# Altium footprint library IDETEC.PcbLib: 275 footprints (part 11 of 18)
Each footprint in its own frame and in the unit in brackets; x right, y up, seen from the top. Pads: shape width x height; smd on the part's side, far side on the other; paste and mask are expansions set on the pad; w line width, h text height; cw(c..) or ccw(c..) is an arc to the next point about the centre after c.
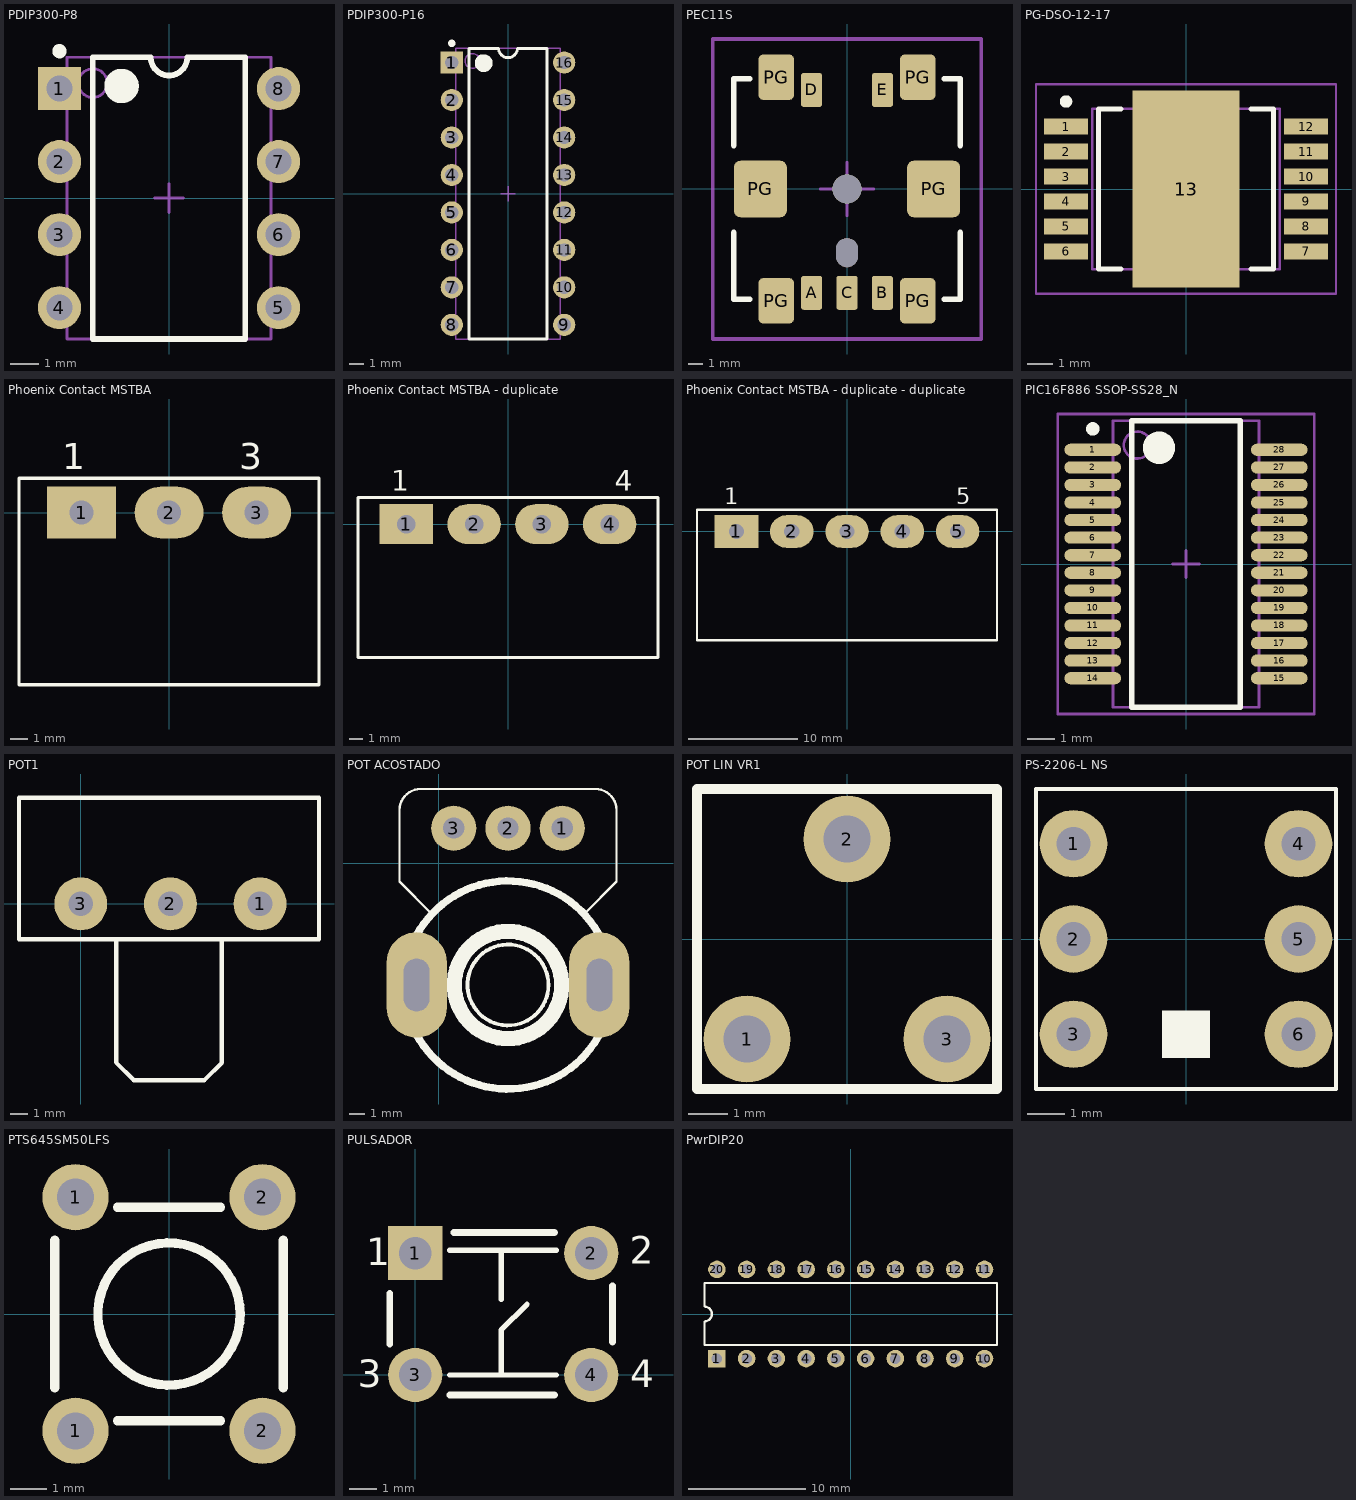
[diagram p10: the footprints below, top view; thin cyan lines are the x and y axes]

## PCBComponent_1 - duplicate [mm]

## PDIP300-P8 [mm] "DIP, 8-Leads, Row Spacing 7.62mm, Pitch 2.54mm, Body 9.5x6.6mm"
height 5.34
pads (8):
  rect 1.5x1.5 hole 0.9: 1(-3.81,3.81)
  round 1.5 hole 0.9: 2(-3.81,1.27) 3(-3.81,-1.27) 4(-3.81,-3.81) 5(3.81,-3.81) 6(3.81,-1.27) 7(3.81,1.27) 8(3.81,3.81)
Top Overlay:
  circle w0.6: c-1.65,3.9 r0.3
  circle w0.25: c-3.81,5.11 r0.125
  lines w0.2: -2.65,-4.9 2.65,-4.9 2.65,4.9 0.635,4.9 cw(c0,4.9) -0.635,4.9 -2.65,4.9 -2.65,-4.9
Mechanical 13:
  circle w0.1: c-2.65,4 r0.5
  lines w0.1: -3.55,-4.9 3.55,-4.9 3.55,4.9 -3.55,4.9 -3.55,-4.9
Mechanical 15:
  lines w0.1: -0.5,0 0.5,0 ; 0,-0.5 0,0.5
3D body "User Library-DIP8test.STEP": height 4.57, standoff -3.81, extent -3.91,-4.955 3.91,4.955

## PDIP300-P16 [mm] "DIP, 16-Leads, Row Spacing 7.62mm, Pitch 2.54mm, Body 19.2x6.6mm"
height 5.34
pads (16):
  rect 1.5x1.5 hole 0.9: 1(-3.81,8.89)
  round 1.5 hole 0.9: 2(-3.81,6.35) 3(-3.81,3.81) 4(-3.81,1.27) 5(-3.81,-1.27) 6(-3.81,-3.81) 7(-3.81,-6.35) 8(-3.81,-8.89) 9(3.81,-8.89) 10(3.81,-6.35) 11(3.81,-3.81) 12(3.81,-1.27) 13(3.81,1.27) 14(3.81,3.81) 15(3.81,6.35) 16(3.81,8.89)
Top Overlay:
  circle w0.6: c-1.65,8.85 r0.3
  circle w0.25: c-3.81,10.19 r0.125
  lines w0.2: -2.65,-9.85 2.65,-9.85 2.65,9.85 0.635,9.85 cw(c0,9.85) -0.635,9.85 -2.65,9.85 -2.65,-9.85
Mechanical 13:
  circle w0.1: c-2.4,9 r0.5
  lines w0.1: -3.55,-9.85 3.55,-9.85 3.55,9.85 -3.55,9.85 -3.55,-9.85
Mechanical 15:
  lines w0.1: -0.5,0 0.5,0 ; 0,-0.5 0,0.5
3D body "User Library-DIP16-300-metric.STEP": height 4.5, standoff -3.5, extent -3.88,-10.3 3.88,10.3

## PEC11S [mm] "Codificadores 12MM SMD INCREMENTAL ENCODER"
pads (13):
  rrect25% 1.5x2.4 smd: A(-2.5,-7.336) B(2.5,-7.336) C(0,-7.336) D(-2.5,7) E(2.5,7)
  rrect25% 3.75x4 smd: PG(-6.125,0) PG(6.125,0)
  rrect25% 2.5x3.2 smd: PG(-5,7.9) PG(-5,-7.9) PG(5,-7.9) PG(5,7.9)
  oval 1.55x2.05 hole 1.55 slot 2.05 at 90 deg unplated: ""(0,-4.5)
  round 2.05 hole 2.05 unplated: ""(0,0)
Top Overlay:
  lines w0.4: -8,-3.071 -8,-7.8 -6.875,-7.8 ; -8,3.071 -8,7.8 -6.875,7.8 ; 6.875,-7.8 8,-7.8 8,-3.071 ; 6.875,7.8 8,7.8 8,3.071
Mechanical 15:
  lines w0.2: -1.887,0 0,0 ; 0,-1.887 0,0 ; 0,1.887 0,0 ; 1.887,0 0,0
  lines w0.25: -9.5,-10.6 9.5,-10.6 9.5,10.6 -9.5,10.6 -9.5,-10.6
3D body "pec11s-929k-n0015.STEP": height 14.2, standoff -1.1, extent -7.477,-9.013 7.523,8.987

## PG-DSO-12-17 [mm] "SOP 12"
height 2.6
pads (13):
  rect 1.75x0.65 smd paste+0 mask+0: 1(-4.8,2.5) 2(-4.8,1.5) 3(-4.8,0.5) 4(-4.8,-0.5) 5(-4.8,-1.5) 6(-4.8,-2.5) 7(4.8,-2.5) 8(4.8,-1.5) 9(4.8,-0.5) 10(4.8,0.5) 11(4.8,1.5) 12(4.8,2.5)
  rect 4.3x7.9 smd paste-3 mask+0: 13(0,0)
Top Overlay:
  circle w0.25: c-4.8,3.5 r0.125
  lines w0.2: -2.6,-3.2 -3.5,-3.2 -3.5,3.2 -2.6,3.2 ; 2.6,-3.2 3.5,-3.2 3.5,3.2 2.6,3.2
Top Paste:
  rectangle: -2,0.2 -0.2,1.8
  rectangle: 0.2,0.2 2,1.8
  rectangle: 0.2,-1.8 2,-0.2
  rectangle: -2,-1.8 -0.2,-0.2
  rectangle: -0.9,-3.9 0.9,-2.1
  rectangle: -0.9,2.1 0.9,3.9
Mechanical 13:
  lines w0.1: -3.75,-3.2 3.75,-3.2 3.75,3.2 -3.75,3.2 -3.75,-3.2
Mechanical 15:
  lines w0.1: -0.5,0 0.5,0 ; 0,-0.5 0,0.5 ; -6,-4.2 -6,4.2 6,4.2 6,-4.2 -6,-4.2
3D body "PG-DSO-12-17.stp": height 2.61, standoff 0, extent -5.15,-3.9 5.15,3.9

## Phoenix Contact MSTBA [mm] "Phoenix Contact MSTBA Series, 5.08 mm Pitch 3 Way 1 Row Right Angle PCB Header, Solder Termination, 12 A"
height 8.6
pads (3):
  rect 4x3 hole 1.4: 1(-5.08,0)
  oval 4x3 hole 1.4: 2(0,0) 3(5.08,0)
Top Overlay:
  lines w0.2: -8.71,-10 8.7,-10 8.7,2 -8.71,2 -8.71,-10
  text "3" at 4.06,2.5 h1.52
  text "1" at -6.21,2.5 h1.52
3D body "14044.stp": height 8.6, standoff -3.5, extent -8.62,-10 8.62,2.002
3D body "14032.stp": height 15.02, standoff 0.02, extent -7.6,-22 7.64,-3.8

## Phoenix Contact MSTBA - duplicate [mm] "Phoenix Contact, Bornera pitch 5.08mm, LxWxH = 15.24x12x8.6mm"
height 8.6
pads (4):
  rect 4x3 hole 1.4: 1(-7.62,0)
  oval 4x3 hole 1.4: 2(-2.54,0) 3(2.54,0) 4(7.62,0)
Top Overlay:
  lines w0.2: -11.25,-10 -11.25,2 11.25,2 11.25,-10 -11.25,-10
  text "1" at -8.75,2.5 h1.52
  text "4" at 8,2.5 h1.52
3D body "1757268.STEP": height 8.6, standoff -3.5, extent -11.16,-10 11.16,2
3D body "1757035.STEP": height 15.02, standoff 0.02, extent -10.16,-22 10.16,-3.8

## Phoenix Contact MSTBA - duplicate - duplicate [mm] "Phoenix Contact MSTBA Series, 5.08 mm Pitch 5 Way 1 Row Right Angle PCB Header, Solder Termination, 12 A"
height 8.6
pads (5):
  rect 4x3 hole 1.4: 1(-10.16,0)
  oval 4x3 hole 1.4: 2(-5.08,0) 3(0,0) 4(5.08,0) 5(10.16,0)
Top Overlay:
  lines w0.2: -13.79,-10 13.785,-10 13.785,2 -13.79,2 -13.79,-10
  text "5" at 10.032,2.5 h1.52
  text "1" at -11.29,2.5 h1.52
3D body "14046.stp": height 8.6, standoff -3.5, extent -13.7,-10.002 13.7,2
3D body "14034.stp": height 15.07, standoff 0.07, extent -12.7,-22 12.7,-3.8

## PIC16F886 SSOP-SS28_N [mm] "SOP, 28-Leads, Body 10.2x5.2mm, Pitch 0.65mm, IPC Medium Density"
height 2
pads (28):
  oval 2.1x0.45 smd: 1(-3.45,4.225) 2(-3.45,3.575) 3(-3.45,2.925) 4(-3.45,2.275) 5(-3.45,1.625) 6(-3.45,0.975) 7(-3.45,0.325) 8(-3.45,-0.325) 9(-3.45,-0.975) 10(-3.45,-1.625) 11(-3.45,-2.275) 12(-3.45,-2.925) 13(-3.45,-3.575) 14(-3.45,-4.225) 15(3.45,-4.225) 16(3.45,-3.575) 17(3.45,-2.925) 18(3.45,-2.275) 19(3.45,-1.625) 20(3.45,-0.975) 21(3.45,-0.325) 22(3.45,0.325) 23(3.45,0.975) 24(3.45,1.625) 25(3.45,2.275) 26(3.45,2.925) 27(3.45,3.575) 28(3.45,4.225)
Top Overlay:
  circle w0.25: c-3.45,5 r0.125
  circle w0.6: c-1,4.3 r0.3
  lines w0.2: -2,-5.3 -2,5.3 2,5.3 2,-5.3 -2,-5.3
Mechanical 13:
  circle w0.1: c-1.8,4.4 r0.5
  lines w0.1: -2.7,-5.3 -2.7,5.3 2.7,5.3 2.7,-5.3 -2.7,-5.3
Mechanical 15:
  lines w0.1: -0.5,0 0.5,0 ; 0,-0.5 0,0.5 ; -4.75,-5.55 -4.75,5.55 4.75,5.55 4.75,-5.55 -4.75,-5.55
3D body "User Library-SSOP-28-1.STEP": height 2.15, standoff 0, extent -3.878,-5.14 3.878,5.19

## POT1 [mm]
pads (3):
  round 3 hole 1.4: 1(10.16,0) 2(5.08,0) 3(0,0)
Top Overlay:
  lines w0.254: -3.5,0 -3.5,6 13.5,6 13.5,-2 -3.5,-2 -3.5,0.03 ; 2,-2 2,-8.99 3,-9.99 7.01,-9.99 8,-9 8,-2.03
3D body "User Library-TrimPot.STEP": height 21.3, standoff -3.9, extent -3.407,-18.475 13.557,5.725

## POT ACOSTADO [mm] "potenciometro"
height 1.1
pads (5):
  round 3 hole 1.4: 1(8.19,2.33) 2(4.59,2.33) 3(0.99,2.33)
  oval 4x7 hole 1.7 slot 3.5 at 90 deg: ""(-1.47,-8.07) ""(10.65,-8.07)
Top Overlay:
  circle w0.5: c4.59,-8.07 r6.902
  circle w0.254: c4.59,-8.07 r2.685
  circle w1: c4.59,-8.07 r3.56
  lines w0.15: -0.48,-3.34 -2.61,-1.21 -2.61,3.53 cw(c-1.21,3.53) -1.21,4.93 10.39,4.93 cw(c10.39,3.53) 11.79,3.53 11.79,-1.21 9.66,-3.34
3D body "SW3dPS-RV09ACF-40_RK09K1130A5R.STEP": height 19.2, standoff -4.6, extent -0.496,-10.37 9.256,2.18

## POT LIN VR1 [mm] "POT LIN VR1"
height 2
pads (3):
  round 2.2 hole 1.2: 1(-2.54,-2.54) 2(0,2.54) 3(2.54,-2.54)
Top Overlay:
  lines w0.254: -3.81,-3.81 -3.81,3.81 3.81,3.81 3.81,-3.81 -3.81,-3.81
3D body "User Library-Bourns 3362F.STEP": height 4.7, standoff -5.47, extent -3.3,-3.754 3.3,3.3

## PS-2206-L NS [mm] "PS-2206-L NS"
pads (6):
  round 1.8 hole 0.9: 1(-3,2.54) 2(-3,0) 3(-3,-2.54) 4(3,2.54) 5(3,0) 6(3,-2.54)
Top Overlay:
  rectangle: -0.635,-3.175 0.635,-1.905
  lines w0.1: -4,-4 -4,4 4,4 4,-4 -4,-4
3D body "SW3dPS-TL 2201.STEP": height 14, standoff -3.5, extent -4.32,-4.16 4.18,4.34

## PTS645SM50LFS [mm] "PTS645SM50LFS"
pads (4):
  round 1.8 hole 1: 1(-2.54,-3.175) 1(-2.54,3.175) 2(2.54,-3.175) 2(2.54,3.175)
Top Overlay:
  circle w0.254: c0,0 r1.932
  lines w0.254: -3.1,-2 -3.1,2 ; -1.4,-2.9 1.4,-2.9 ; -1.4,2.9 1.4,2.9 ; 3.1,-2 3.1,2
3D body "User Library-TPxxxx (Switch).STEP": height 4.9, standoff -3.59, extent -3.01,-3.954 2.99,4.014

## PULSADOR [mm]
pads (4):
  rect 2x2 hole 1.2: 1(0,4.5)
  round 2 hole 1.2: 2(6.5,4.5) 3(0,0) 4(6.5,0)
Top Overlay:
  lines w0.2: 1.27,0 5.207,0 ; 1.27,4.6 5.207,4.6 ; 3.175,0 3.175,1.143 3.175,1.651 4.127,2.603 ; 3.175,2.794 3.175,4.6
  lines w0.254: -0.937,1.148 -0.937,3.005 ; 1.275,-0.744 5.143,-0.744 ; 1.425,5.258 5.146,5.258 ; 7.28,1.212 7.28,3.294
  text "3" at -2.111,-0.455 h1.02
  text "1" at -1.814,4.051 h1.02
  text "2" at 7.925,4.107 h1.02
  text "4" at 7.945,-0.455 h1.02
3D body "FSM4JH.STEP": height 4.8, standoff -3.5, extent -0.926,-0.742 7.286,5.258

## PwrDIP20 [mm] "DIP; 20 Leads; Row Spacing 7.62 mm; Pitch 2.54 mm"
height 5.1
pads (20):
  rect 1.5x1.5 hole 0.9: 1(-11.43,-3.81)
  round 1.5 hole 0.9: 2(-8.89,-3.81) 3(-6.35,-3.81) 4(-3.81,-3.81) 5(-1.27,-3.81) 6(1.27,-3.81) 7(3.81,-3.81) 8(6.35,-3.81) 9(8.89,-3.81) 10(11.43,-3.81) 11(11.43,3.81) 12(8.89,3.81) 13(6.35,3.81) 14(3.81,3.81) 15(1.27,3.81) 16(-1.27,3.81) 17(-3.81,3.81) 18(-6.35,3.81) 19(-8.89,3.81) 20(-11.43,3.81)
Top Overlay:
  lines w0.2: -12.5,-2.65 12.5,-2.65 12.5,2.65 -12.5,2.65 -12.5,0.635 cw(c-12.5,0) -12.5,-0.635 -12.5,-2.65
3D body "User Library-DIP20.STEP": height 4.57, standoff -3.81, extent -13.27,-3.91 13.27,3.91